# Altium footprint library LimeNet-Micro_2v1.PcbLib: 86 footprints (part 4 of 6)
Each footprint in its own frame and in the unit in brackets; x right, y up, seen from the top. Pads: shape width x height; smd on the part's side, far side on the other; paste and mask are expansions set on the pad; w line width, h text height; cw(c..) or ccw(c..) is an arc to the next point about the centre after c.
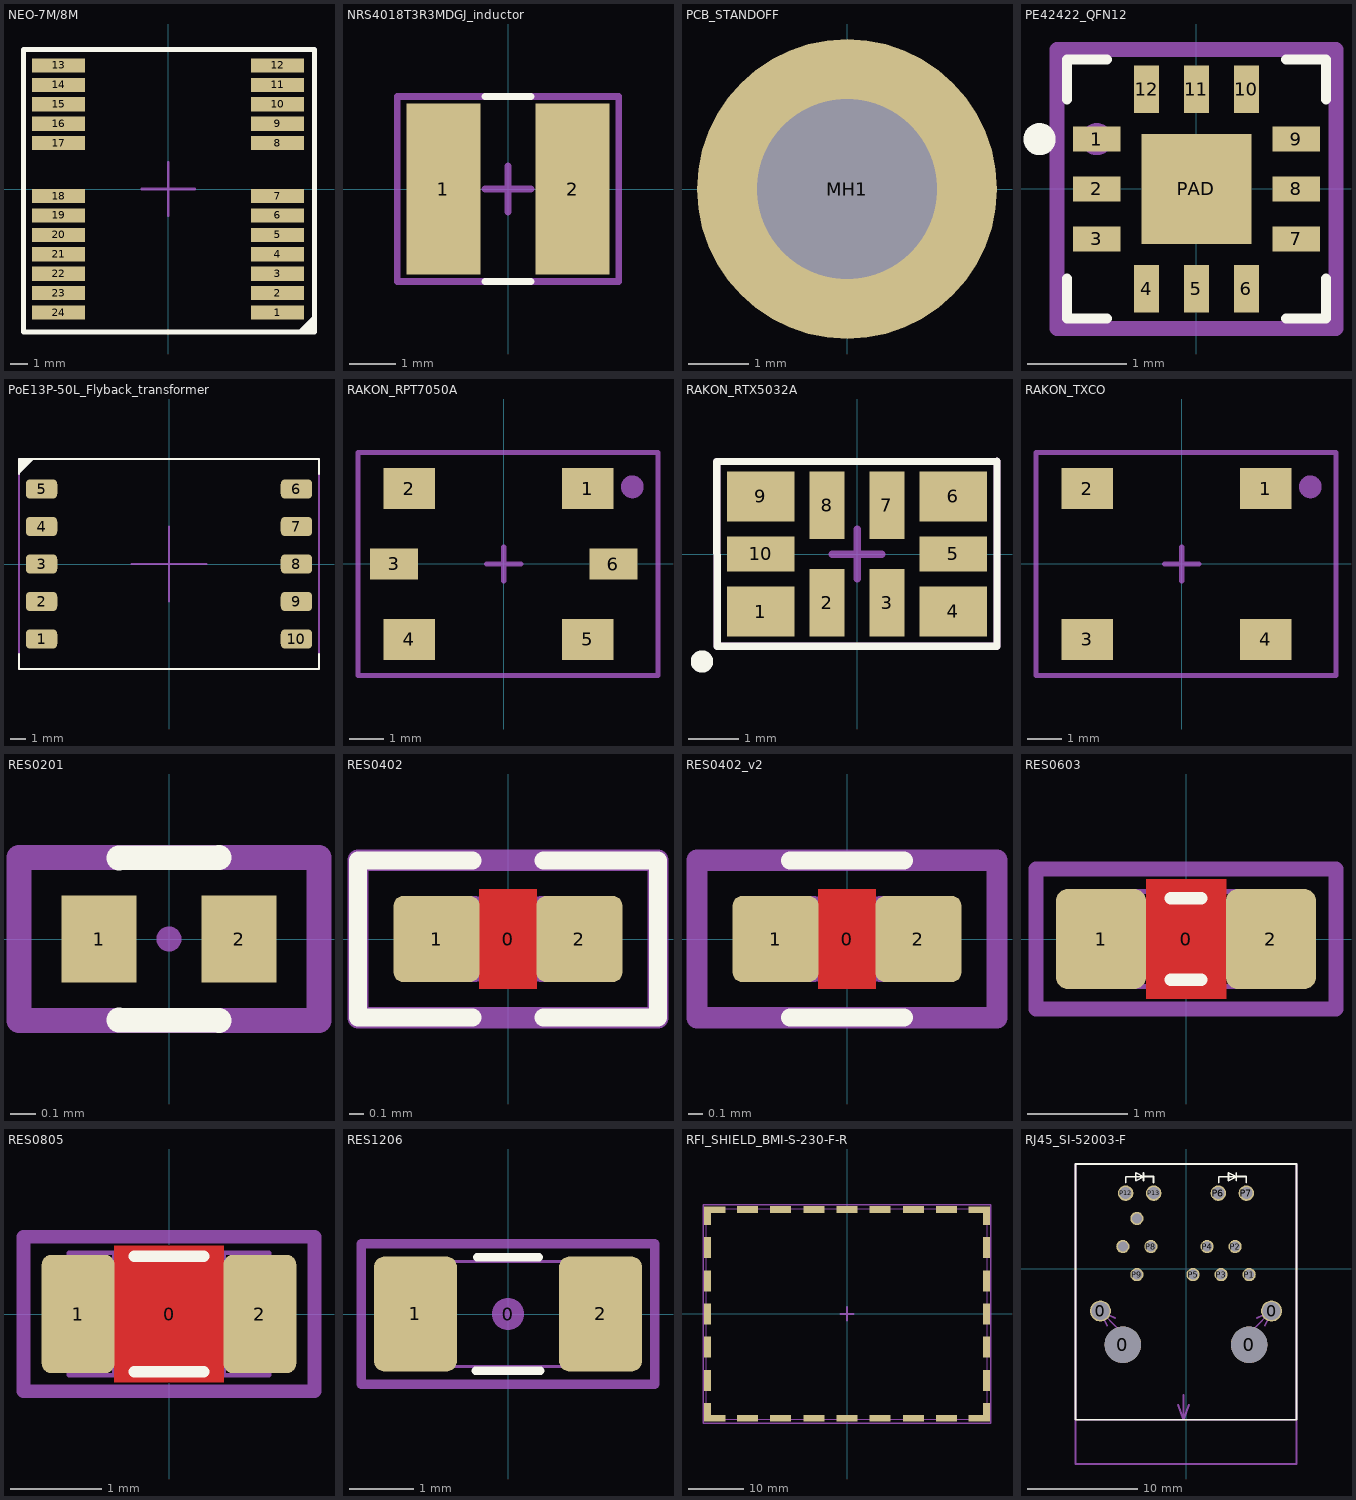
[diagram p3: the footprints below, top view; thin cyan lines are the x and y axes]

## NEO-7M/8M [mm]
pads (24):
  rect 3x0.8 smd: 1(6.2,-7) 2(6.2,-5.9) 3(6.2,-4.8) 4(6.2,-3.7) 5(6.2,-2.6) 6(6.2,-1.5) 7(6.2,-0.4) 8(6.2,2.6) 9(6.2,3.7) 10(6.2,4.8) 11(6.2,5.9) 12(6.2,7) 13(-6.2,7) 14(-6.2,5.9) 15(-6.2,4.8) 16(-6.2,3.7) 17(-6.2,2.6) 18(-6.2,-0.4) 19(-6.2,-1.5) 20(-6.2,-2.6) 21(-6.2,-3.7) 22(-6.2,-4.8) 23(-6.2,-5.9) 24(-6.2,-7)
Top Overlay:
  region: 7.5,-8.1 8.3,-7.3 8.3,-8.1
  lines w0.3: 7.5,-8.1 8.3,-7.3 ; -8.2,-8.1 -8.2,7.9 8.3,7.9 8.3,-8.1 -8.2,-8.1
Mechanical 15:
  circle w0.4: c6.2,-7 r0.1
  lines w0.15: -1.5,0 1.5,0 ; 0,-1.5 0,1.5 ; -8.2,-8.1 -8.2,7.9 8.3,7.9 8.3,-8.1 -8.2,-8.1
  text ".Designator" at -0.953,-2.85 h0.55
3D body "NEO.STEP": height 2.33, standoff 0, extent -6.1,-8 6.1,8

## NRS4018T3R3MDGJ_inductor [mm]
pads (2):
  rect 1.6x3.7 smd mask+0.05: 1(-1.4,0) 2(1.4,0)
Top Overlay:
  lines w0.15: -0.5,-2 0.5,-2 ; -0.5,2 0.5,2
Mechanical 15:
  lines w0.15: -0.5,0 0.5,0 ; 0,-0.5 0,0.5 ; -2.4,-2 2.4,-2 2.4,2 -2.4,2 -2.4,-2
  text "No polarity" at -1.6,-1.7 h0.3
  text ".Designator" at -0.75,0.65 h0.55
3D body "User Library-nr3015_4x4.STEP": height 1.89, standoff -0.11, extent -2,-1.998 2.001,2.002

## PCB_STANDOFF [mm]
pads (1):
  round 5 hole 3: MH1(0,0)
Top Paste:
  drawing of 32 lines, arcs and shapes, not listed
Bottom Paste:
  drawing of 32 lines, arcs and shapes, not listed
Mechanical 15:
  lines w0.15: -2.2,0 0,0 ; 0,-2.2 0,0 ; 0,2.2 0,0 ; 2.2,0 0,0
  text ".Designator" at -1.225,-0.425 h0.55
3D body "Hex Spacer MF M3 L5mm.stp": height 5.2, standoff -5.8, extent -2.862,-2.5 2.912,2.5

## PE42422_QFN12 [mm]
pads (13):
  rect 0.475x0.25 smd mask+0.05: 1(-1,0.5) 2(-1,0) 3(-1,-0.5) 7(1,-0.5) 8(1,0) 9(1,0.5)
  rect 0.25x0.475 smd mask+0.05: 4(-0.5,-1) 5(0,-1) 6(0.5,-1) 10(0.5,1) 11(0,1) 12(-0.5,1)
  rect 1.1x1.1 smd mask+0.05: PAD(0,0)
Top Overlay:
  circle w0.25: c-1.575,0.5 r0.035
  lines w0.1: -1.3,-0.9 -1.3,-1.3 -0.9,-1.3 ; -1.3,0.9 -1.3,1.3 -0.9,1.3 ; 0.9,-1.3 1.3,-1.3 1.3,-0.9 ; 0.9,1.3 1.3,1.3 1.3,0.9
Mechanical 15:
  circle w0.25: c-1,0.5 r0.035
  lines w0.15: -0.2,0 0.2,0 ; 0,-0.2 0,0.2 ; -1.4,-1.4 -1.4,1.4 1.4,1.4 1.4,-1.4 -1.4,-1.4
  text ".Designator" at -0.965,-1.1 h0.55
3D body: height 0.55, standoff 0, extent -1,-1 1,1
3D body: height 0.58, standoff 0.53, extent -0.873,0.476 -0.475,0.875

## PoE13P-50L_Flyback_transformer [mm]
pads (10):
  rrect50% 2.1x1.3 smd mask+0.05: 1(-8.5,-5) 2(-8.5,-2.5) 3(-8.5,0) 4(-8.5,2.5) 5(-8.5,5) 6(8.5,5) 7(8.5,2.5) 8(8.5,0) 9(8.5,-2.5) 10(8.5,-5)
Top Overlay:
  region: -10,6 -9,7 -10,7
  lines w0.15: -10,-6 -10,-7 10,-7 10,-6 ; -10,6 -10,7 10,7 10,6
Mechanical 15:
  lines w0.15: -2.5,0 2.5,0 ; 0,-2.5 0,2.5 ; -10,-7 10,-7 10,7 -10,7 -10,-7
  text "10" at 9.075,-5.65 h0.55
  text "5" at -8.4,4.85 h0.55
  text "6" at 9,4.55 h0.55
  text "1" at -8.275,-5.375 h0.55
  text ".Designator" at 0.975,3.875 h0.55
3D body "Coilcraft-POE13P-50L.step": height 12.7, standoff 0, extent -8.875,-6.73 8.875,6.73

## RAKON_RPT7050A [mm]
pads (6):
  rect 1.5x1.2 smd: 1(2.45,2.2) 2(-2.75,2.2) 4(-2.75,-2.2) 5(2.45,-2.2)
  rect 1.4x0.9 smd: 3(-3.2,0) 6(3.2,0)
Mechanical 15:
  circle w0.35: c3.75,2.25 r0.158
  lines w0.15: -0.5,0 0.5,0 ; 0,-0.5 0,0.5 ; -4.25,-3.25 -4.25,3.25 4.5,3.25 4.5,-3.25 -4.25,-3.25
  text ".Designator" at -1.425,2.275 h0.55
3D body: height 0.1, standoff 0, extent 4.15,1.8 4.25,1.9

## RAKON_RTX5032A [mm]
pads (10):
  rect 1.35x1 smd mask+0.05: 1(-1.925,-1.15) 4(1.925,-1.15) 6(1.925,1.15) 9(-1.925,1.15)
  rect 0.7x1.35 smd mask+0.05: 2(-0.6,-0.975) 3(0.6,-0.975) 7(0.6,0.975) 8(-0.6,0.975)
  rect 1.35x0.7 smd mask+0.05: 5(1.925,0) 10(-1.925,0)
Top Overlay:
  circle w0.25: c-3.1,-2.15 r0.1
  lines w0.15: -2.8,-1.85 -2.8,1.85 2.8,1.85 2.8,-1.85 -2.8,-1.85
Mechanical 15:
  circle w0.25: c-1.9,-1.1 r0.1
  lines w0.15: -0.5,0 0,0 ; 0,-0.5 0,0 ; 0,0.5 0,0 ; 0.5,0 0,0 ; -2.8,-1.85 -2.8,1.85 2.8,1.85 2.8,-1.85 -2.8,-1.85
  text ".Designator" at 1.6,-0.786 h0.55
3D body "User Library-Crystal.step": height 0.9, standoff -0.05, extent -2.5,-1.6 2.5,1.6

## RAKON_TXCO [mm]
pads (4):
  rect 1.5x1.2 smd: 1(2.45,2.2) 2(-2.75,2.2) 3(-2.75,-2.2) 4(2.45,-2.2)
Mechanical 15:
  circle w0.35: c3.75,2.25 r0.158
  lines w0.15: -0.5,0 0.5,0 ; 0,-0.5 0,0.5 ; -4.25,-3.25 -4.25,3.25 4.5,3.25 4.5,-3.25 -4.25,-3.25
  text ".Designator" at -1.425,-0.725 h0.55
3D body: height 1.6, standoff 0, extent -3.5,-2.3 3.2,2.3
3D body "RES 0402 (1005 metric).STEP": height 2, standoff 1.6, extent -2.525,-1.975 -1.475,-1.425
3D body "Crystal TXC Corp 7M series.STEP": height 2.4, standoff 1.6, extent -2.95,-0.6 0.35,2
3D body "CAP 0402 (1005 metric).STEP": height 2.15, standoff 1.6, extent 2.125,-1.025 2.675,0.025
3D body "CAP 0402 (1005 metric).STEP": height 2.15, standoff 1.6, extent 2.125,0.775 2.675,1.825
3D body "CAP 0402 (1005 metric).STEP": height 2.15, standoff 1.6, extent 0.975,-1.975 2.025,-1.425
3D body "CAP 0402 (1005 metric).STEP": height 2.15, standoff 1.6, extent -0.825,-1.975 0.225,-1.425

## RES0201 [mm]
pads (2):
  rect 0.3x0.35 smd mask+0.05: 1(-0.28,0) 2(0.28,0)
Top Overlay:
  lines w0.1: -0.2,-0.325 0.2,-0.325 ; -0.2,0.325 0.2,0.325
Mechanical 15:
  circle w0.05: c0,0 r0.025
  lines w0.1: -0.6,-0.325 0.6,-0.325 0.6,0.325 -0.6,0.325 -0.6,-0.325
  text ".Designator" at 46.25,1.848 h0.55
3D body: height 0.25, standoff 0, extent -0.17,-0.15 0.17,0.15
3D body: height 0.25, standoff 0, extent -0.3,-0.15 -0.17,0.15
3D body: height 0.25, standoff 0, extent 0.17,-0.15 0.3,0.15

## RES0402 [mm]
pads (3):
  round 0.2 on Mech15: 0(0,0)
  rrect20% 0.6x0.6 smd: 1(-0.5,0) 2(0.5,0)
Top Layer:
  pour cut-out: -0.2,0.35 0.2,0.35 0.2,-0.35 -0.2,-0.35
Top Overlay:
  lines w0.127: -0.25,-0.55 -1.05,-0.55 -1.05,0.55 -0.25,0.55 ; 0.25,-0.55 1.05,-0.55 1.05,0.55 0.25,0.55
Mechanical 13:
  lines w0.05: 0.225,-0.274 -0.225,-0.274 0.225,-0.274 ; -0.525,-0.275 -0.225,-0.275 -0.225,0.275 -0.525,0.275 -0.525,-0.275 ; -0.225,0.274 0.225,0.274 -0.225,0.274 ; 0.225,-0.275 0.225,0.275 0.525,0.275 0.525,-0.275 0.225,-0.275
Mechanical 15:
  lines w0.15: -1.05,-0.55 1.05,-0.55 1.05,0.55 -1.05,0.55 -1.05,-0.55
  text ".Designator" at -1,-1.375 h0.55
3D body "RES 0402 (1005 metric).STEP": height 0.4, standoff 0, extent -0.525,-0.275 0.525,0.275

## RES0402_v2 [mm]
pads (3):
  round 0.2 on Mech15: 0(0,0)
  rrect20% 0.6x0.6 smd: 1(-0.5,0) 2(0.5,0)
Top Layer:
  pour cut-out: -0.2,0.35 0.2,0.35 0.2,-0.35 -0.2,-0.35
Top Overlay:
  lines w0.127: -0.4,-0.55 0.4,-0.55 ; -0.4,0.55 0.4,0.55
Mechanical 13:
  lines w0.05: 0.225,-0.274 -0.225,-0.274 0.225,-0.274 ; -0.525,-0.275 -0.225,-0.275 -0.225,0.275 -0.525,0.275 -0.525,-0.275 ; -0.225,0.274 0.225,0.274 -0.225,0.274 ; 0.225,-0.275 0.225,0.275 0.525,0.275 0.525,-0.275 0.225,-0.275
Mechanical 15:
  lines w0.15: -1.05,-0.55 1.05,-0.55 1.05,0.55 -1.05,0.55 -1.05,-0.55
  text ".Designator" at 1.9,-0.2 h0.55
3D body "RES 0402 (1005 metric).STEP": height 0.4, standoff 0, extent -0.525,-0.275 0.525,0.275

## RES0603 [mm]
pads (3):
  round 0.254 on Mech15: 0(0,0)
  rrect25% 0.9x1 smd: 1(-0.85,0) 2(0.85,0)
Top Layer:
  pour cut-out: -0.4,0.6 0.4,0.6 0.4,-0.6 -0.4,-0.6
Top Overlay:
  lines w0.127: -0.152,-0.406 0.152,-0.406 ; -0.152,0.406 0.152,0.406
Mechanical 13:
  lines w0.05: -0.875,-0.475 -0.475,-0.475 -0.475,0.475 -0.875,0.475 -0.875,-0.475 ; -0.475,-0.474 0.475,-0.474 -0.475,-0.474 ; -0.475,0.474 0.475,0.474 -0.475,0.474 ; 0.475,-0.475 0.475,0.475 0.875,0.475 0.875,-0.475 0.475,-0.475
Mechanical 15:
  lines w0.15: -1.5,-0.7 -1.5,0.7 1.5,0.7 1.5,-0.7 -1.5,-0.7
  text ".Designator" at 0.835,1.413 h0.55
3D body "RES 0603 (1608 metric).STEP": height 0.54, standoff -0.01, extent -0.875,-0.475 0.875,0.475

## RES0805 [mm]
pads (3):
  round 0.254 on Mech15: 0(0,0)
  rrect25% 0.8x1.3 smd: 1(-1,0) 2(1,0)
Top Layer:
  pour cut-out: -0.6,0.75 0.6,0.75 0.6,-0.75 -0.6,-0.75
Top Overlay:
  lines w0.127: -0.381,-0.635 0.381,-0.635 ; -0.381,0.635 0.381,0.635
Mechanical 13:
  lines w0.05: 0.6,-0.674 -0.6,-0.674 ; -0.6,-0.674 0.6,-0.674 ; -0.6,-0.675 -1.1,-0.675 -1.1,0.675 -0.6,0.675 -0.6,-0.675 ; 0.6,-0.675 1.1,-0.675 1.1,0.675 0.6,0.675 ; 0.6,-0.675 0.6,0.675 ; 0.6,0.674 -0.6,0.674 0.6,0.674
Mechanical 15:
  lines w0.15: -1.6,-0.85 -1.6,0.85 1.6,0.85 1.6,-0.85 -1.6,-0.85
  text ".Designator" at -0.925,1.325 h0.55
3D body "RES 0805 (2012 metric).STEP": height 0.69, standoff -0.01, extent -1.1,-0.675 1.1,0.675

## RES1206 [mm]
pads (3):
  round 0.508 on Mech15: 0(0,0)
  rrect25% 1.3x1.8 smd: 1(-1.45,0) 2(1.45,0)
Top Overlay:
  lines w0.127: -0.508,-0.889 0.508,-0.889 ; -0.483,0.889 0.483,0.889
Mechanical 13:
  lines w0.05: 1.025,-0.824 -1.025,-0.824 1.025,-0.824 ; -1.625,-0.825 -1.625,0.825 -1.025,0.825 -1.025,-0.825 -1.625,-0.825 ; -1.025,0.824 1.025,0.824 -1.025,0.824 ; 1.025,-0.825 1.625,-0.825 1.625,0.825 1.025,0.825 1.025,-0.825
Mechanical 15:
  lines w0.15: -2.3,-1.1 2.3,-1.1 2.3,1.1 -2.3,1.1 -2.3,-1.1
  text ".Designator" at 0.975,0.9 h0.55
3D body "RES 1206 (3216 metric).STEP": height 0.69, standoff -0.01, extent -1.625,-0.825 1.625,0.825

## RFI_SHIELD_BMI-S-230-F-R [mm]
pads (32):
  rect 1.2x3.35 smd mask+0.05: 1(-25.2,-17.787) 1(-25.2,17.762) 1(25.2,-17.787) 1(25.2,17.762)
  rect 1.2x3.8 smd mask+0.05: 1(-25.2,-12.013) 1(-25.2,-6.013) 1(-25.2,-0.012) 1(-25.2,5.988) 1(-25.2,11.988) 1(25.2,-12.013) 1(25.2,-6.013) 1(25.2,-0.012) 1(25.2,5.988) 1(25.2,11.988)
  rect 3.85x1.2 smd mask+0.05: 1(-23.875,-18.862) 1(-23.875,18.838) 1(23.875,-18.862) 1(23.875,18.838)
  rect 3.8x1.2 smd mask+0.05: 1(-18,-18.837) 1(-18,18.863) 1(-12,-18.837) 1(-12,18.863) 1(-6,-18.837) 1(-6,18.863) 1(0,-18.837) 1(0,18.863) 1(6,-18.837) 1(6,18.863) 1(12,-18.837) 1(12,18.863) 1(18,-18.837) 1(18,18.863)
Mechanical 13:
  lines w0.15: -25.425,-19.062 -25.425,19.037 25.375,19.037 25.375,-19.062 -25.425,-19.062 ; -17.65,-19.062 -17.65,-19.063
Mechanical 15:
  lines w0.3: -1.25,0 1.25,0 ; 0,-1.25 0,1.25 ; -26,-19.75 -26,19.75 26,19.75 26,-19.75 -26,-19.75
  text "RF shield (frame + cover)" at -22.35,-19.2 h0.55
  text ".Designator" at -25.55,-19.2 h0.55
3D body "Masach Technologies-MS511-20.STEP": height 6.6, standoff -0.8, extent -26.15,-19.8 26.15,19.8

## RJ45_SI-52003-F [mm]
pads (17):
  round 1.9 hole 1.6 mask+0.05: 0(-7.745,-3.81) 0(7.745,-3.81)
  round 3.3 hole 3.3 unplated mask+0.05: 0(-5.715,-6.86) 0(5.715,-6.86)
  round 1.2 hole 0.9 mask+0.05: P1(5.715,-0.51) P2(4.445,2.03) P3(3.175,-0.51) P4(1.905,2.03) P5(0.635,-0.51) P8(-3.175,2.03) P9(-4.445,-0.51) P10(-5.715,2.03) P11(-4.445,4.57)
  round 1.4 hole 1.1 mask+0.05: P6(2.925,6.86) P7(5.465,6.86) P12(-5.465,6.86) P13(-2.925,6.86)
Top Overlay:
  lines w0.15: -5.44,7.815 -5.44,8.34 -3.84,8.34 ; -3.84,7.99 -3.84,8.69 ; -3.84,8.365 -2.94,8.365 -2.94,7.815 ; 2.95,7.815 2.95,8.34 4.55,8.34 ; 4.55,7.99 4.55,8.69 ; 4.55,8.365 5.45,8.365 5.45,7.815 ; -3.84,8.34 -4.54,7.99 -4.54,8.69 -3.84,8.34 ; 4.55,8.34 3.85,8.69 3.85,7.99 4.55,8.34 ; -10,-13.66 10,-13.66 10,9.5 -10,9.5 -10,-13.66
Mechanical 15:
  lines w0.15: -10,-13.66 10,-13.66 ; -7.119,-5.143 -7.745,-3.81 ; -6.412,-4.436 -7.745,-3.81 ; -6.147,-5.408 -7.745,-3.81 ; -0.725,-12.275 -0.225,-13.66 ; -0.225,-11.4 -0.225,-13.66 ; 0.275,-12.275 -0.225,-13.66 ; 6.147,-5.408 7.745,-3.81 ; 6.412,-4.436 7.745,-3.81 ; 7.119,-5.143 7.745,-3.81 ; -10,-17.65 -10,9.5 10,9.5 10,-17.65 -10,-17.65
  text "6 / (A)" at 3.55,7.555 h0.55
  text "12 / (A)" at -4.675,7.555 h0.55
  text "13 / (C)" at -2.225,7.68 h0.55
  text "7 / (C)" at 6.1,7.505 h0.55
  text "board edge" at 2.625,-10.47 h0.55
  text "1" at 5.825,-0.27 h0.55
  text "2" at 4.675,2.28 h0.55
  text "3" at 3.35,-0.245 h0.55
  text "4" at 2.125,2.317 h0.55
  text "5" at 0.8,-0.245 h0.55
  text "8" at -2.975,2.33 h0.55
  text "9" at -4.275,-0.195 h0.55
  text "10" at -5.225,2.255 h0.55
  text "11" at -4.075,4.73 h0.55
  text ".Designator" at 1.05,-2.295 h0.55
  text "Assembly Note: solder plated holes" at 8.8,-6.32 h0.55
3D body: height 13.6, standoff 0, extent -8,3.025 8,7.7
3D body "ACC-M-RJE60-188-5X01-REVT1_v2.STEP": height 14.73, standoff -0.04, extent -9.105,-17.62 9.105,3.87
3D body: height 0, standoff -2.5, extent -5.961,6.361 -4.965,7.359
3D body: height 0, standoff -2.5, extent -3.421,6.361 -2.425,7.359
3D body: height 0, standoff -2.5, extent 2.429,6.361 3.425,7.359
3D body: height 0, standoff -2.5, extent 4.969,6.361 5.965,7.359
3D body: height 0, standoff -2.5, extent -4.842,4.171 -4.045,4.969
3D body: height 0, standoff -2.5, extent 1.508,1.631 2.305,2.429
3D body: height 0, standoff -2.5, extent 4.048,1.631 4.845,2.429
3D body: height 0, standoff -2.5, extent -3.572,1.631 -2.775,2.429
3D body: height 0, standoff -2.5, extent -6.112,1.631 -5.315,2.429
3D body: height 0, standoff -2.5, extent -4.842,-0.909 -4.045,-0.111
3D body: height 0, standoff -2.5, extent 0.238,-0.909 1.035,-0.111
3D body: height 0, standoff -2.5, extent 2.778,-0.909 3.575,-0.111
3D body: height 0, standoff -2.5, extent 5.318,-0.909 6.115,-0.111
3D body: height 0, standoff -2.5, extent -7.315,-8.457 -4.115,-5.263
3D body: height 0, standoff -2.5, extent 4.115,-8.457 7.315,-5.263
3D body: height 0, standoff -2.5, extent -8.539,-4.608 -6.945,-3.012
3D body: height 0, standoff -2.5, extent 6.951,-4.608 8.545,-3.012